# Altium footprint library 5ko.PcbLib: 126 footprints (part 8 of 8)
Each footprint in its own frame and in the unit in brackets; x right, y up, seen from the top. Pads: shape width x height; smd on the part's side, far side on the other; paste and mask are expansions set on the pad; w line width, h text height; cw(c..) or ccw(c..) is an arc to the next point about the centre after c.
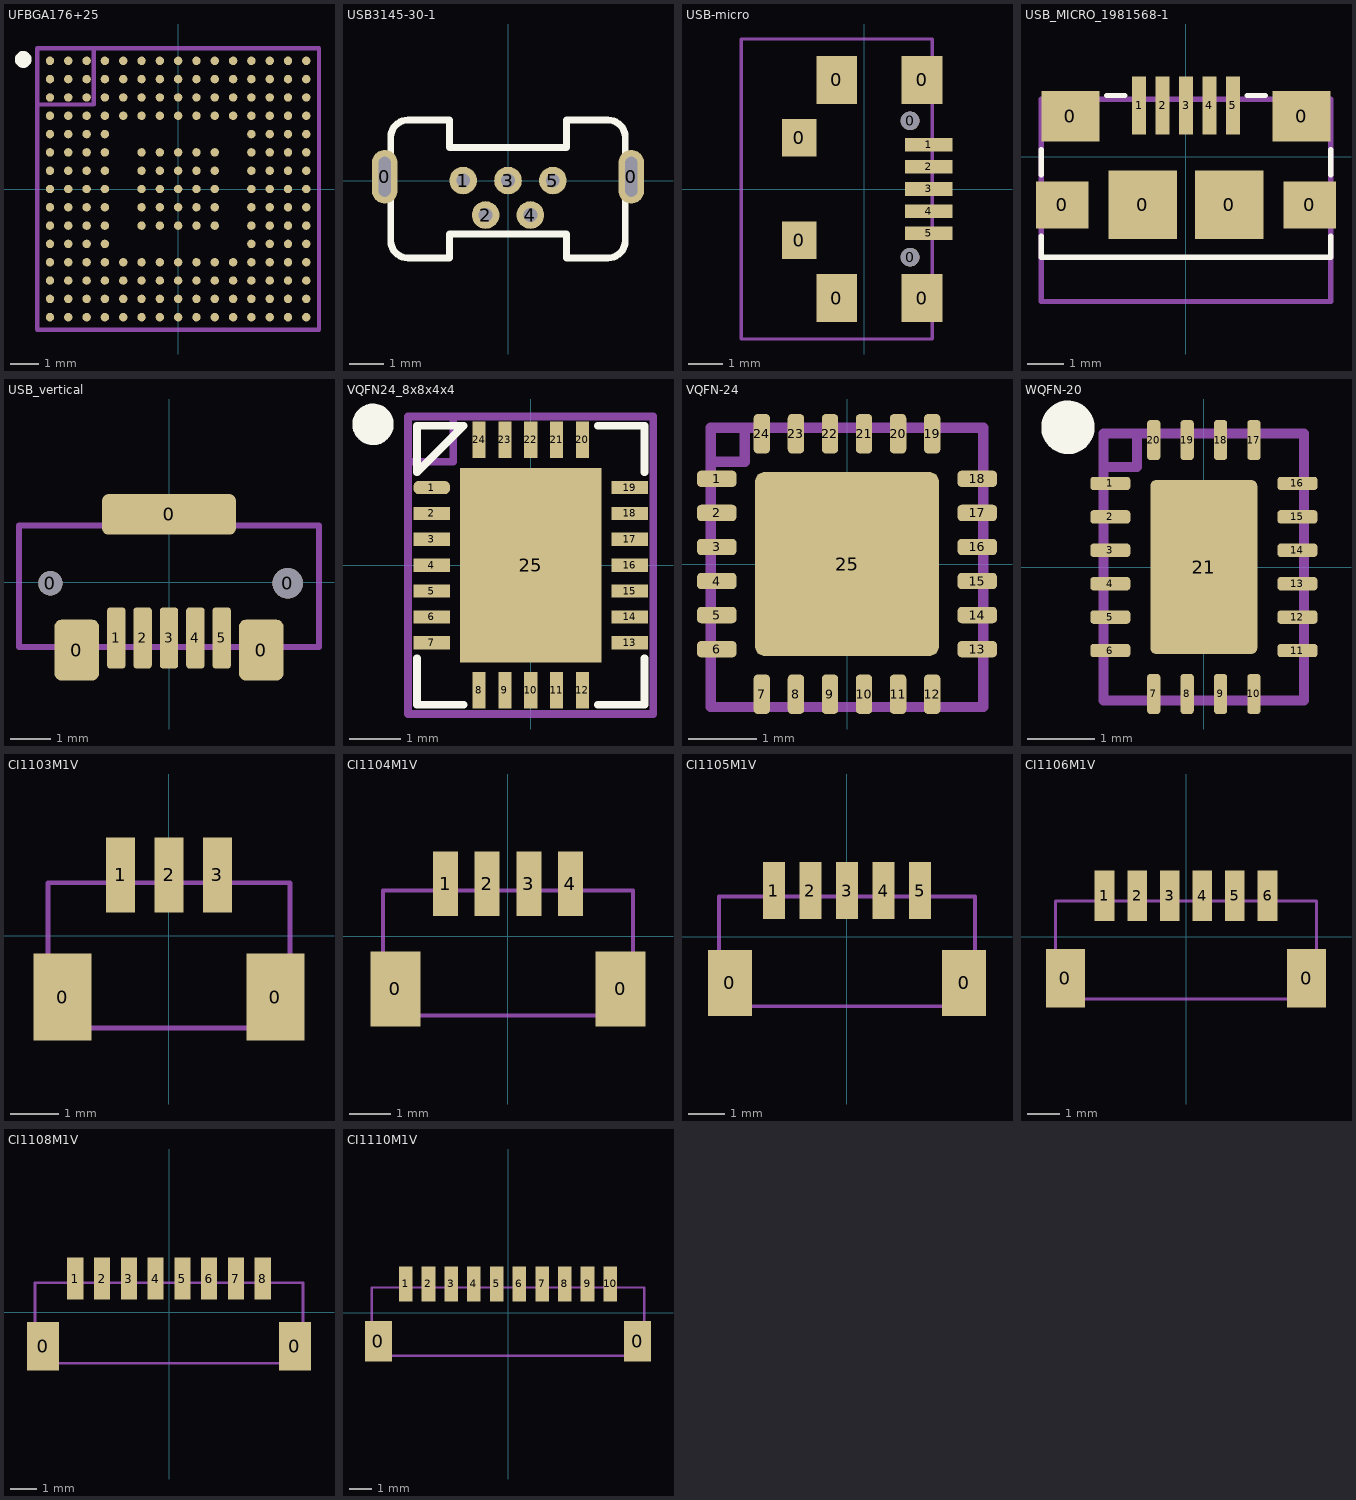
[diagram p7: the footprints below, top view; thin cyan lines are the x and y axes]

## UFBGA176+25 [mm]
height 0.6
pads (201):
  round 0.3 smd mask+0.1: A1(-4.55,4.55) A2(-3.9,4.55) A3(-3.25,4.55) A4(-2.6,4.55) A5(-1.95,4.55) A6(-1.3,4.55) A7(-0.65,4.55) A8(0,4.55) A9(0.65,4.55) A10(1.3,4.55) A11(1.95,4.55) A12(2.6,4.55) A13(3.25,4.55) A14(3.9,4.55) A15(4.55,4.55) B1(-4.55,3.9) B2(-3.9,3.9) B3(-3.25,3.9) B4(-2.6,3.9) B5(-1.95,3.9) B6(-1.3,3.9) B7(-0.65,3.9) B8(0,3.9) B9(0.65,3.9) B10(1.3,3.9) B11(1.95,3.9) B12(2.6,3.9) B13(3.25,3.9) B14(3.9,3.9) B15(4.55,3.9) C1(-4.55,3.25) C2(-3.9,3.25) C3(-3.25,3.25) C4(-2.6,3.25) C5(-1.95,3.25) C6(-1.3,3.25) C7(-0.65,3.25) C8(0,3.25) C9(0.65,3.25) C10(1.3,3.25) C11(1.95,3.25) C12(2.6,3.25) C13(3.25,3.25) C14(3.9,3.25) C15(4.55,3.25) D1(-4.55,2.6) D2(-3.9,2.6) D3(-3.25,2.6) D4(-2.6,2.6) D5(-1.95,2.6) D6(-1.3,2.6) D7(-0.65,2.6) D8(0,2.6) D9(0.65,2.6) D10(1.3,2.6) D11(1.95,2.6) D12(2.6,2.6) D13(3.25,2.6) D14(3.9,2.6) D15(4.55,2.6) E1(-4.55,1.95) E2(-3.9,1.95) E3(-3.25,1.95) E4(-2.6,1.95) E12(2.6,1.95) E13(3.25,1.95) E14(3.9,1.95) E15(4.55,1.95) F1(-4.55,1.3) F2(-3.9,1.3) F3(-3.25,1.3) F4(-2.6,1.3) F6(-1.3,1.3) F7(-0.65,1.3) F8(0,1.3) F9(0.65,1.3) F10(1.3,1.3) F12(2.6,1.3) F13(3.25,1.3) F14(3.9,1.3) F15(4.55,1.3) G1(-4.55,0.65) G2(-3.9,0.65) G3(-3.25,0.65) G4(-2.6,0.65) G6(-1.3,0.65) G7(-0.65,0.65) G8(0,0.65) G9(0.65,0.65) G10(1.3,0.65) G12(2.6,0.65) G13(3.25,0.65) G14(3.9,0.65) G15(4.55,0.65) H1(-4.55,0) H2(-3.9,0) H3(-3.25,0) H4(-2.6,0) H6(-1.3,0) H7(-0.65,0) H8(0,0) H9(0.65,0) H10(1.3,0) H12(2.6,0) H13(3.25,0) H14(3.9,0) H15(4.55,0) J1(-4.55,-0.65) J2(-3.9,-0.65) J3(-3.25,-0.65) J4(-2.6,-0.65) J6(-1.3,-0.65) J7(-0.65,-0.65) J8(0,-0.65) J9(0.65,-0.65) J10(1.3,-0.65) J12(2.6,-0.65) J13(3.25,-0.65) J14(3.9,-0.65) J15(4.55,-0.65) K1(-4.55,-1.3) K2(-3.9,-1.3) K3(-3.25,-1.3) K4(-2.6,-1.3) K6(-1.3,-1.3) K7(-0.65,-1.3) K8(0,-1.3) K9(0.65,-1.3) K10(1.3,-1.3) K12(2.6,-1.3) K13(3.25,-1.3) K14(3.9,-1.3) K15(4.55,-1.3) L1(-4.55,-1.95) L2(-3.9,-1.95) L3(-3.25,-1.95) L4(-2.6,-1.95) L12(2.6,-1.95) L13(3.25,-1.95) L14(3.9,-1.95) L15(4.55,-1.95) M1(-4.55,-2.6) M2(-3.9,-2.6) M3(-3.25,-2.6) M4(-2.6,-2.6) M5(-1.95,-2.6) M6(-1.3,-2.6) M7(-0.65,-2.6) M8(0,-2.6) M9(0.65,-2.6) M10(1.3,-2.6) M11(1.95,-2.6) M12(2.6,-2.6) M13(3.25,-2.6) M14(3.9,-2.6) M15(4.55,-2.6) N1(-4.55,-3.25) N2(-3.9,-3.25) N3(-3.25,-3.25) N4(-2.6,-3.25) N5(-1.95,-3.25) N6(-1.3,-3.25) N7(-0.65,-3.25) N8(0,-3.25) N9(0.65,-3.25) N10(1.3,-3.25) N11(1.95,-3.25) N12(2.6,-3.25) N13(3.25,-3.25) N14(3.9,-3.25) N15(4.55,-3.25) P1(-4.55,-3.9) P2(-3.9,-3.9) P3(-3.25,-3.9) P4(-2.6,-3.9) P5(-1.95,-3.9) P6(-1.3,-3.9) P7(-0.65,-3.9) P8(0,-3.9) P9(0.65,-3.9) P10(1.3,-3.9) P11(1.95,-3.9) P12(2.6,-3.9) P13(3.25,-3.9) P14(3.9,-3.9) P15(4.55,-3.9) R1(-4.55,-4.55) R2(-3.9,-4.55) R3(-3.25,-4.55) R4(-2.6,-4.55) R5(-1.95,-4.55) R6(-1.3,-4.55) R7(-0.65,-4.55) R8(0,-4.55) R9(0.65,-4.55) R10(1.3,-4.55) R11(1.95,-4.55) R12(2.6,-4.55) R13(3.25,-4.55) R14(3.9,-4.55) R15(4.55,-4.55)
Top Overlay:
  circle w0.3: c-5.5,4.6 r0.15
Mechanical 15:
  lines w0.15: -5,3 -3,3 -3,5 ; -5,-5 -5,5 5,5 5,-5 -5,-5
  text ".Designator" at -2.1,-0.225 h0.5
3D body "User Library-UFBGA176+25.STEP": height 0.44, standoff 0, extent -5,-5 5,5

## USB3145-30-1 [mm] "Vertical Micro USB"
pads (7):
  oval 0.75x1.55 hole 0.35 slot 1.15 at 90 deg mask+0.07: 0(-3.575,0.11) 0(3.575,0.11)
  round 0.8 hole 0.4 mask+0.07: 1(-1.3,0) 2(-0.65,-1) 3(0,0) 4(0.65,-1) 5(1.3,0)
Top Overlay:
  lines w0.2: -3.4,-1.745 ccw(c-2.9,-1.745) -2.9,-2.245 -1.7,-2.245 -1.7,-1.545 1.7,-1.545 1.7,-2.245 2.9,-2.245 ccw(c2.9,-1.745) 3.4,-1.745 3.4,1.255 ccw(c2.9,1.255) 2.9,1.755 1.7,1.755 1.7,0.955 -1.7,0.955 -1.7,1.755 -2.9,1.755 ccw(c-2.9,1.255) -3.4,1.255 -3.4,-1.745
3D body "User Library-USB3145-30-0-X_revB.STEP": height 6, standoff -2.3, extent -3.7,-2.245 3.7,1.755

## USB-micro [mm]
pads (13):
  rect 1x1.1 smd: 0(-1.9,-1.5) 0(-1.9,1.5)
  rect 1.2x1.4 smd: 0(-0.8,-3.2) 0(-0.8,3.2) 0(1.7,-3.2) 0(1.7,3.2)
  round 0.55 hole 0.55 unplated paste+0 mask+0: 0(1.35,-2) 0(1.35,2)
  rect 1.4x0.4 smd: 1(1.9,1.3) 2(1.9,0.65) 3(1.9,0) 4(1.9,-0.65) 5(1.9,-1.3)
Mechanical 15:
  lines w0.1: -3.6,-4.4 2,-4.4 2,4.4 -3.6,4.4 -3.6,-4.4
  text ".Designator" at -3,-0.1 h0.5
3D body "MICRO-USB.stp": height 2.83, standoff -0.23, extent -3.6,-4.4 2,4.4

## USB_MICRO_1981568-1 [mm] "1981568-1"
height 2.51
pads (11):
  rect 1.45x1.3 smd mask+0.07: 0(-3.425,-1.325) 0(3.425,-1.325)
  rect 1.6x1.4 smd mask+0.07: 0(-3.2,1.125) 0(3.2,1.125)
  rect 1.9x1.9 smd mask+0.07: 0(-1.2,-1.325) 0(1.2,-1.325)
  rect 0.4x1.6 smd mask+0.07: 1(-1.3,1.425) 2(-0.65,1.425) 3(0,1.425) 4(0.65,1.425) 5(1.3,1.425)
Top Overlay:
  lines w0.15: -4,-2.2 -4,-2.775 4,-2.775 4,-2.2 ; -4,-0.5 -4,0.2 ; -2.2,1.7 -1.7,1.7 ; 1.7,1.7 2.2,1.7 ; 4,-0.5 4,0.2
Mechanical 15:
  lines w0.15: -4,-4 -4,1.6 4,1.6 4,-4 -4,-4
  text ".Designator" at -2,-0.575 h0.5
3D body "User Library-10118192C.step": height 2.74, standoff -0.27, extent -3.956,-4.036 3.956,1.625

## USB_vertical [mm]
pads (10):
  round 0.6 hole 0.6 unplated: 0(-2.925,-0.025)
  rrect30% 1.1x1.5 smd: 0(-2.275,-1.675) 0(2.275,-1.675)
  rrect30% 3.3x1 smd: 0(0,1.675)
  round 0.75 hole 0.75 unplated: 0(2.925,-0.025)
  rrect30% 0.45x1.5 smd: 1(-1.3,-1.375) 2(-0.65,-1.375) 3(0,-1.375) 4(0.65,-1.375) 5(1.3,-1.375)
Mechanical 15:
  lines w0.15: -3.7,-1.6 -3.7,1.4 3.7,1.4 3.7,-1.6 -3.7,-1.6
  text ".Designator" at -0.9,-0.1 h0.3
3D body "usb_vertical.stp": height 5.25, standoff -0.8, extent -3.7,-1.61 3.7,1.35

## VQFN24_8x8x4x4 [mm]
pads (25):
  rrect80% 0.708x0.255 smd paste+0 mask+0: 1(-1.916,1.5)
  rect 0.708x0.255 smd paste+0 mask+0: 2(-1.916,1) 3(-1.916,0.5) 4(-1.916,0) 5(-1.916,-0.5) 6(-1.916,-1) 7(-1.916,-1.5) 13(1.916,-1.5) 14(1.916,-1) 15(1.916,-0.5) 16(1.916,0) 17(1.916,0.5) 18(1.916,1) 19(1.916,1.5)
  rect 0.255x0.708 smd paste+0 mask+0: 8(-1,-2.424) 9(-0.5,-2.424) 10(0,-2.424) 11(0.5,-2.424) 12(1,-2.424) 20(1,2.424) 21(0.5,2.424) 22(0,2.424) 23(-0.5,2.424) 24(-1,2.424)
  rect 2.743x3.759 smd paste+0 mask+0: 25(0,0)
Top Overlay:
  circle w0.4: c-3.05,2.725 r0.2
  lines w0.15: -2.2,-1.8 -2.2,-2.7 -1.3,-2.7 ; 1.3,-2.7 2.2,-2.7 2.2,-1.8 ; 1.3,2.7 2.2,2.7 2.2,1.8 ; -2.2,1.8 -2.2,2.7 -1.3,2.7 -2.2,1.8
Mechanical 15:
  lines w0.15: -2.372,2 -1.5,2 -1.5,2.88
  lines w0.152: -2.372,-2.88 -1.229,-2.88 1.229,-2.88 2.372,-2.88 2.372,-1.729 2.372,1.729 2.372,2.88 1.229,2.88 -1.229,2.88 -2.372,2.88 -2.372,1.729 -2.372,-1.729 -2.372,-2.88
  text ".Designator" at -1,-0.1 h0.3
3D body: height 0.25, standoff 0, extent 0,0 0.254,0.254
3D body "VQFN24_RHF_TEX.step": height 0.99, standoff 0, extent -2.07,-2.578 2.07,2.578

## VQFN-24 [mm]
pads (25):
  rrect50% 0.58x0.24 smd mask+0.07: 1(-1.913,1.25) 2(-1.913,0.75) 3(-1.913,0.25) 4(-1.913,-0.25) 5(-1.913,-0.75) 6(-1.913,-1.25) 13(1.913,-1.25) 14(1.913,-0.75) 15(1.913,-0.25) 16(1.913,0.25) 17(1.913,0.75) 18(1.913,1.25)
  rrect50% 0.24x0.58 smd mask+0.07: 7(-1.25,-1.913) 8(-0.75,-1.913) 9(-0.25,-1.913) 10(0.25,-1.913) 11(0.75,-1.913) 12(1.25,-1.913) 19(1.25,1.913) 20(0.75,1.913) 21(0.25,1.913) 22(-0.25,1.913) 23(-0.75,1.913) 24(-1.25,1.913)
  rrect10% 2.7x2.7 smd mask+0.07: 25(0,0)
Mechanical 15:
  lines w0.15: -2,1.5 -1.5,1.5 -1.5,2 ; -2,-2.1 -2,2 2,2 2,-2.1 -2,-2.1
  text ".Designator" at -0.9,-0.1 h0.3
3D body "VQFN-24.step": height 1.05, standoff -0.02, extent -2.05,-2.05 2.05,2.05

## WQFN-20 [mm]
height 0.8
pads (21):
  rrect50% 0.6x0.2 smd mask+0.07: 1(-1.4,1.25) 2(-1.4,0.75) 3(-1.4,0.25) 4(-1.4,-0.25) 5(-1.4,-0.75) 6(-1.4,-1.25) 11(1.4,-1.25) 12(1.4,-0.75) 13(1.4,-0.25) 14(1.4,0.25) 15(1.4,0.75) 16(1.4,1.25)
  rrect50% 0.2x0.6 smd mask+0.07: 7(-0.75,-1.9) 8(-0.25,-1.9) 9(0.25,-1.9) 10(0.75,-1.9) 17(0.75,1.9) 18(0.25,1.9) 19(-0.25,1.9) 20(-0.75,1.9)
  rrect10% 1.6x2.6 smd mask+0.07: 21(0,0)
Top Overlay:
  circle w0.4: c-2.034,2.09 r0.2
Mechanical 15:
  lines w0.15: -1.5,1.5 -1,1.5 -1,2 ; -1.5,-2 1.5,-2 1.5,2 -1.5,2 -1.5,-2
  text ".Designator" at -0.9,-0.1 h0.3
3D body "WQFN20.step": height 0.81, standoff -0.01, extent -1.51,-2.01 1.51,2.01

## СI1103М1V [mm] "3pin"
pads (5):
  rect 1.2x1.8 smd: 0(-2.2,-1.262) 0(2.2,-1.262)
  rect 0.6x1.55 smd: 1(-1,1.263) 2(0,1.263) 3(1,1.263)
Mechanical 15:
  lines w0.1: -2.5,-1.9 2.5,-1.9 2.5,1.1 -2.5,1.1 -2.5,-1.9
  text ".Designator" at -1.6,-0.437 h0.5
3D body "BM03B-SRSS-TB.STEP": height 4.32, standoff 0, extent -2.5,-1.9 2.5,1.7

## СI1104М1V [mm] "4pin"
pads (6):
  rect 1.2x1.8 smd: 0(-2.7,-1.262) 0(2.7,-1.262)
  rect 0.6x1.55 smd: 1(-1.5,1.262) 2(-0.5,1.262) 3(0.5,1.262) 4(1.5,1.262)
Mechanical 15:
  lines w0.1: -3,-1.9 3,-1.9 3,1.1 -3,1.1 -3,-1.9
  text ".Designator" at -2.1,-0.437 h0.5
3D body "BM04B-SRSS-TB.STEP": height 4.3, standoff -0.02, extent -3,-1.9 3,1.7

## СI1105М1V [mm] "5pin"
pads (7):
  rect 1.2x1.8 smd: 0(-3.2,-1.262) 0(3.2,-1.262)
  rect 0.6x1.55 smd: 1(-2,1.262) 2(-1,1.262) 3(0,1.262) 4(1,1.262) 5(2,1.262)
Mechanical 15:
  lines w0.1: -3.5,-1.9 -3.5,1.1 3.5,1.1 3.5,-1.9 -3.5,-1.9
  text ".Designator" at -1.9,-0.4 h0.5
3D body "BM05B-SRSS-TB.STEP": height 4.3, standoff -0.02, extent -3.5,-1.9 3.5,1.7

## СI1106М1V [mm] "6pin"
pads (8):
  rect 1.2x1.8 smd: 0(-3.7,-1.262) 0(3.7,-1.262)
  rect 0.6x1.55 smd: 1(-2.5,1.262) 2(-1.5,1.262) 3(-0.5,1.262) 4(0.5,1.262) 5(1.5,1.262) 6(2.5,1.262)
Mechanical 15:
  lines w0.1: -4,-1.9 -4,1.1 4,1.1 4,-1.9 -4,-1.9
  text ".Designator" at -1.9,-0.4 h0.5
3D body "BM06B-SRSS-TB.STEP": height 4.3, standoff -0.02, extent -4,-1.9 4,1.7

## СI1108М1V [mm] "8pin"
pads (10):
  rect 1.2x1.8 smd: 0(-4.7,-1.262) 0(4.7,-1.262)
  rect 0.6x1.55 smd: 1(-3.5,1.262) 2(-2.5,1.262) 3(-1.5,1.262) 4(-0.5,1.262) 5(0.5,1.262) 6(1.5,1.262) 7(2.5,1.262) 8(3.5,1.262)
Mechanical 15:
  lines w0.1: -5,-1.9 5,-1.9 5,1.1 -5,1.1 -5,-1.9
  text ".Designator" at -1.9,-0.4 h0.5
3D body "BM08B-SRSS-TB.STEP": height 4.3, standoff -0.02, extent -5,-1.9 5,1.7

## СI1110М1V [mm] "8pin"
pads (12):
  rect 1.2x1.8 smd: 0(-5.7,-1.262) 0(5.7,-1.262)
  rect 0.6x1.55 smd: 1(-4.5,1.262) 2(-3.5,1.262) 3(-2.5,1.262) 4(-1.5,1.262) 5(-0.5,1.262) 6(0.5,1.262) 7(1.5,1.262) 8(2.5,1.262) 9(3.5,1.262) 10(4.5,1.262)
Mechanical 15:
  lines w0.1: -6,-1.9 -6,1.1 6,1.1 6,-1.9 -6,-1.9
  text ".Designator" at -2.1,-0.562 h0.5
3D body "BM10B-SRSS-TB.STEP": height 4.3, standoff -0.02, extent -6,-1.9 6,1.7